# Altium footprint library agh_racing_2018.PcbLib: 174 footprints (part 1 of 11)
Each footprint in its own frame and in the unit in brackets; x right, y up, seen from the top. Pads: shape width x height; smd on the part's side, far side on the other; paste and mask are expansions set on the pad; w line width, h text height; cw(c..) or ccw(c..) is an arc to the next point about the centre after c.
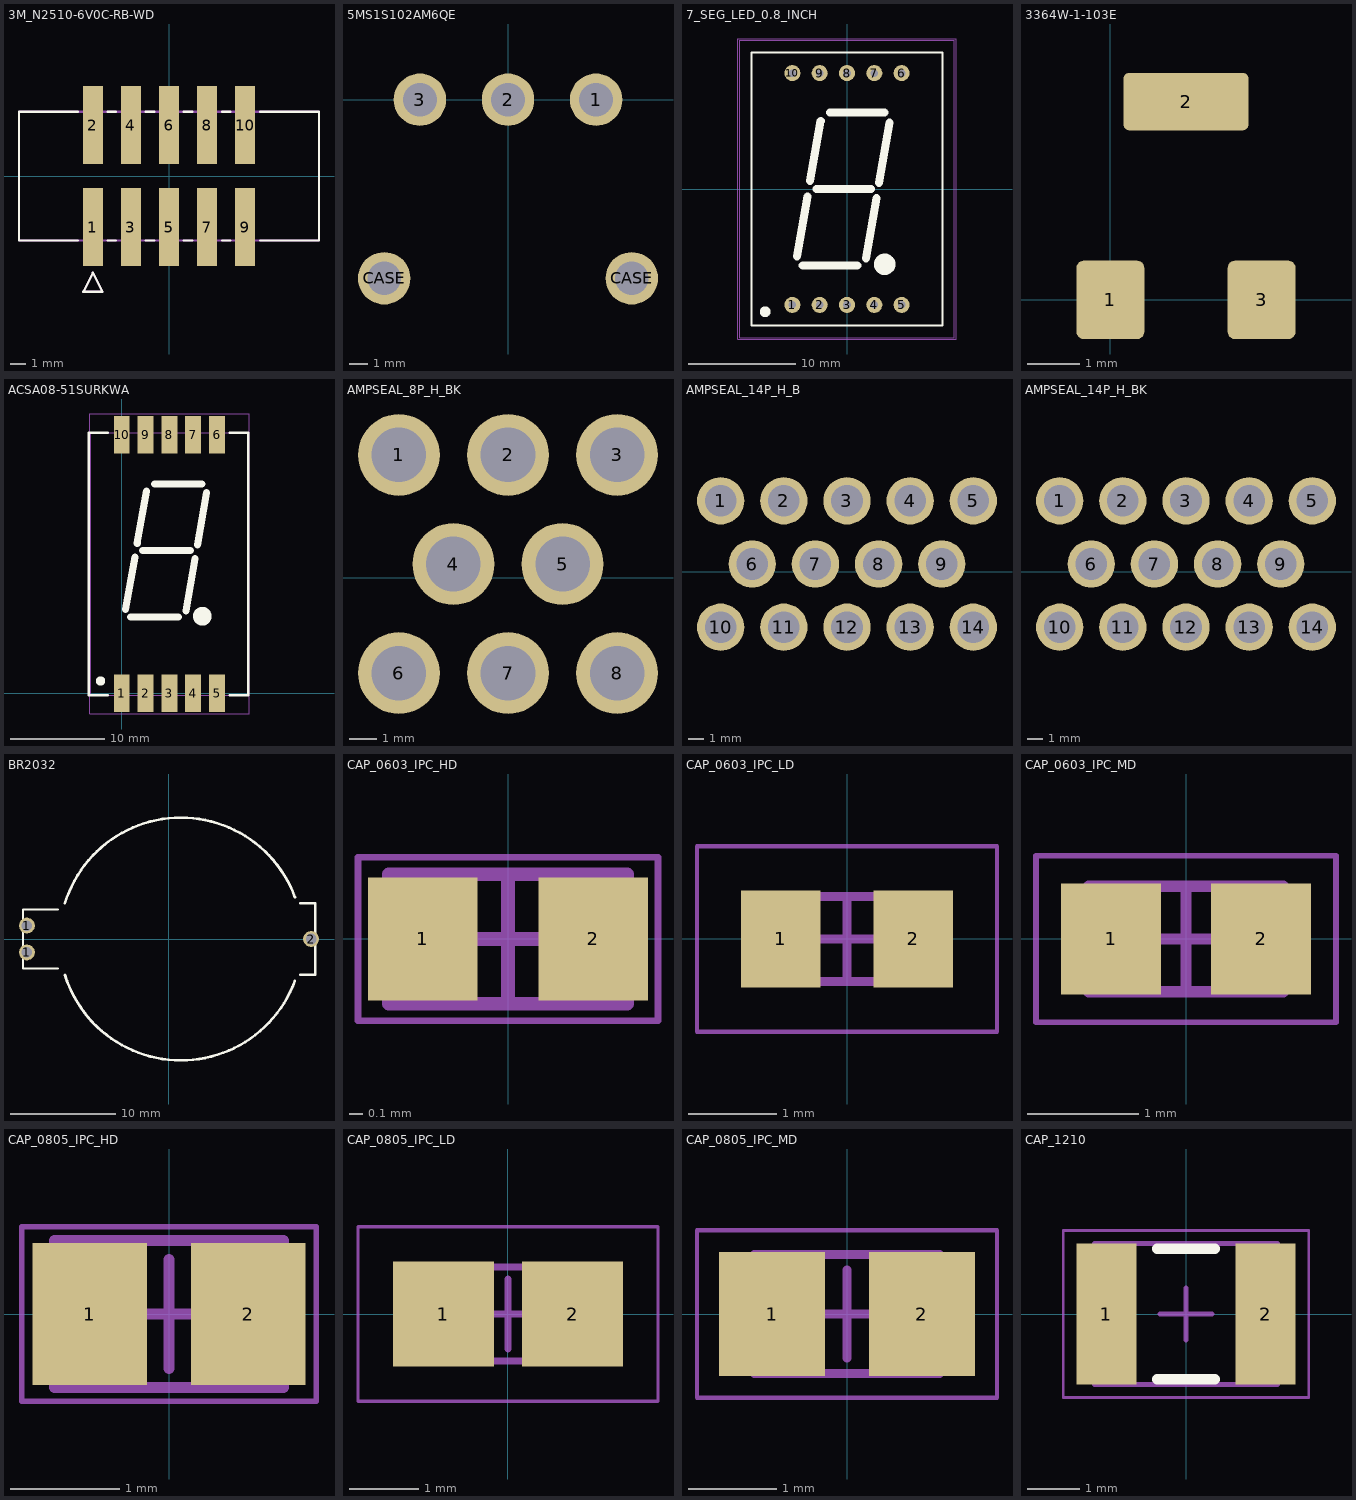
[diagram p0: the footprints below, top view; thin cyan lines are the x and y axes]

## 3M_N2510-6V0C-RB-WD [mil]
pads (10):
  rect 52x204 smd: 1(-200,-134) 2(-200,134) 3(-100,-134) 4(-100,134) 5(0,-134) 6(0,134) 7(100,-134) 8(100,134) 9(200,-134) 10(200,134)
Top Overlay:
  lines w6: -239,-169 -394,-169 -394,169 -239,169 ; -161,-169 -139,-169 ; -161,169 -139,169 ; -61,-169 -39,-169 ; -61,169 -39,169 ; 39,-169 61,-169 ; 39,169 61,169 ; 139,-169 161,-169 ; 139,169 161,169 ; 195,-173 195,-188 205,-188 205,-173 ; 239,-169 394,-169 394,169 239,169 ; -225,-304 -175,-304 -200,-254 -225,-304
Mechanical 15:
  lines w6: -394,-169 -394,169 394,169 394,-169 -394,-169 ; -225,-304 -175,-304 -200,-254 -225,-304

## 5MS1S102AM6QE [mm] "Slide switch, 2 pos, right angle"
height 6.6
pads (5):
  round 2.8 hole 1.8: 1(4.7,0) 2(0,0) 3(-4.7,0) CASE(-6.605,-9.53) CASE(6.605,-9.53)
3D body "slide_switch.SLDPRT": height 6.61, standoff -3.17, extent -6.785,-15.488 6.785,0.635

## 7_SEG_LED_0.8_INCH [mm] "OPTO PLUS LED CORP. OPD-S8023LB-BW"
height 10
pads (10):
  round 1.5 hole 0.7: 1(-5.08,-10.8) 2(-2.54,-10.8) 3(0,-10.8) 4(2.54,-10.8) 5(5.08,-10.8) 6(5.08,10.8) 7(2.54,10.8) 8(0,10.8) 9(-2.54,10.8) 10(-5.08,10.8)
Top Overlay:
  circle w0.5: c-7.62,-11.43 r0.25
  circle w1: c3.511,-7.01 r0.5
  lines w0.2: -8.89,-12.7 8.89,-12.7 8.89,12.7 -8.89,12.7 -8.89,-12.7
  lines w0.762: -4.661,-6.266 -3.681,-0.686 ; -4.122,-7.112 0.958,-7.112 ; -3.432,0.762 -2.452,6.342 ; -2.852,0 2.228,0 ; -1.582,7.112 3.498,7.112 ; 1.761,-6.442 2.741,-0.862 ; 2.99,0.586 3.97,6.166
Mechanical 1:
  lines w0.1: -10,-13.85 -10,13.85 10,13.85 10,-13.85 -10,-13.85
Mechanical 15:
  lines w0.05: -10.16,-13.97 -10.16,13.97 10.16,13.97 10.16,-13.97 -10.16,-13.97
3D body: height 12.5, standoff 2.5, extent -10,-13.85 10,13.85

## 3364W-1-103E [mm] "Trimming Potentiometer"
height 1.5
pads (3):
  rrect20% 1.3x1.5 smd: 1(0,0) 3(2.9,0)
  rrect20% 2.4x1.1 smd: 2(1.45,3.8)
3D body "pot_trim_bourns.SLDPRT": height 1.01, standoff -0.03, extent -0.45,-0.55 3.35,3.95

## ACSA08-51SURKWA [mm] "Kingbright 0.8\" SMD, common anode"
height 10
pads (10):
  rect 1.7x4 smd: 1(0,0) 2(2.54,0) 3(5.08,0) 4(7.62,0) 5(10.16,0) 6(10.16,27.6) 7(7.62,27.6) 8(5.08,27.6) 9(2.54,27.6) 10(0,27.6)
Top Overlay:
  circle w0.5: c-2.261,1.321 r0.25
  circle w1: c8.591,8.23 r0.5
  lines w0.254: -1.5,-0.2 -3.5,-0.2 -3.5,27.8 -1.5,27.8 ; 11.5,-0.2 13.5,-0.2 13.5,27.8 11.5,27.8
  lines w0.762: 0.419,8.974 1.399,14.554 ; 0.958,8.128 6.038,8.128 ; 1.648,16.002 2.628,21.582 ; 2.228,15.24 7.308,15.24 ; 3.498,22.352 8.578,22.352 ; 6.841,8.798 7.821,14.378 ; 8.07,15.826 9.05,21.406
Mechanical 1:
  lines w0.1: -3.32,-0.2 13.48,-0.2 13.48,27.8 -3.32,27.8 -3.32,-0.2
Mechanical 15:
  lines w0.05: -3.42,-2.2 -3.42,29.8 13.58,29.8 13.58,-2.2 -3.42,-2.2
3D body "ACSX08-51.STEP": height 3.8, standoff 0, extent -3.32,-0.2 13.48,27.8

## AMPSEAL_8P_H_BK [mm] "Ampseal socket, 8P, horizontal, black"
height 28
pads (8):
  round 3 hole 2: 1(6.5,4.5) 2(10.5,4.5) 3(14.5,4.5) 4(8.5,0.5) 5(12.5,0.5) 6(6.5,-3.5) 7(10.5,-3.5) 8(14.5,-3.5)
via 21,0 diameter 3.1 hole 3
via 0,0 diameter 3.1 hole 3
3D body "Ampseal_8P_Black.SLDPRT": height 27.78, standoff -4.32, extent -9.9,-31.3 30.9,6.5

## AMPSEAL_14P_H_B [mm] "Ampseal socket, 14P, horizontal, blue"
height 28
pads (14):
  round 3 hole 2: 1(6.5,4.5) 2(10.5,4.5) 3(14.5,4.5) 4(18.5,4.5) 5(22.5,4.5) 6(8.5,0.5) 7(12.5,0.5) 8(16.5,0.5) 9(20.5,0.5) 10(6.5,-3.5) 11(10.5,-3.5) 12(14.5,-3.5) 13(18.5,-3.5) 14(22.5,-3.5)
via 0,0 diameter 3.1 hole 3
via 29,0 diameter 3.1 hole 3
3D body "Ampseal_14P_Blue.SLDPRT": height 27.78, standoff -4.32, extent -9.9,-31.3 38.9,6.5

## AMPSEAL_14P_H_BK [mm] "Ampseal socket, 14P, horizontal, black"
height 28
pads (14):
  round 3 hole 2: 1(6.5,4.5) 2(10.5,4.5) 3(14.5,4.5) 4(18.5,4.5) 5(22.5,4.5) 6(8.5,0.5) 7(12.5,0.5) 8(16.5,0.5) 9(20.5,0.5) 10(6.5,-3.5) 11(10.5,-3.5) 12(14.5,-3.5) 13(18.5,-3.5) 14(22.5,-3.5)
via 0,0 diameter 3.1 hole 3
via 29,0 diameter 3.1 hole 3
3D body "Ampseal_14P_Black.SLDPRT": height 27.78, standoff -4.32, extent -9.9,-31.3 38.9,6.5

## BR2032 [mm]
pads (3):
  round 1.5 hole 1: 1(-13.46,-1.27) 1(-13.46,1.27) 2(13.46,0)
Top Overlay:
  lines w0.2: -10.54,-2.8 -13.84,-2.8 -13.84,2.8 -10.54,2.8
  lines w0.254: -9.863,3.376 cw(c1.13,0) 11.93,3.952 ; -9.855,-3.404 ccw(c1.13,0) 11.918,-3.984 ; 12.46,-3.4 13.86,-3.4 13.86,3.4 12.46,3.4
3D body "c-120591-1-j1-3d.stp": height 6.02, standoff -3.43, extent -13.645,-9.525 13.66,9.525

## CAP_0603_IPC_HD [mm] "Chip Capacitor, 2-Leads, Body 1,60x0,80mm, IPC High Density"
height 0.95
pads (2):
  rect 0.8x0.9 smd: 1(-0.625,0) 2(0.625,0)
Mechanical 13:
  lines w0.1: -0.875,-0.475 -0.875,0.475 0.875,0.475 0.875,-0.475 -0.875,-0.475
Mechanical 15:
  lines w0.05: -1.1,-0.6 -1.1,0.6 1.1,0.6 1.1,-0.6 -1.1,-0.6
  lines w0.1: -0.475,0 0.475,0 ; 0,-0.475 0,0.475
3D body "CAP_0603_IPC_HD.step": height 0.95, standoff 0, extent -0.875,-0.475 0.875,0.475

## CAP_0603_IPC_LD [mm] "Chip Capacitor, 2-Leads, Body 1.60x0.81mm, IPC Low Density"
height 0.9
pads (2):
  rect 0.9x1.1 smd: 1(-0.75,0) 2(0.75,0)
Mechanical 13:
  lines w0.1: -0.875,-0.48 0.875,-0.48 0.875,0.48 -0.875,0.48 -0.875,-0.48
Mechanical 15:
  lines w0.05: -1.7,-1.05 1.7,-1.05 1.7,1.05 -1.7,1.05 -1.7,-1.05
  lines w0.1: -0.48,0 0.48,0 ; 0,-0.48 0,0.48
3D body "CAP_0603_IPC_LD.step": height 0.9, standoff 0, extent -0.875,-0.48 0.875,0.48

## CAP_0603_IPC_MD [mm] "Chip Capacitor, 2-Leads, Body 1,60x0,80mm, IPC Medium Density"
height 0.95
pads (2):
  rect 0.9x1 smd: 1(-0.675,0) 2(0.675,0)
Mechanical 13:
  lines w0.1: -0.875,-0.475 -0.875,0.475 0.875,0.475 0.875,-0.475 -0.875,-0.475
Mechanical 15:
  lines w0.05: -1.35,-0.75 -1.35,0.75 1.35,0.75 1.35,-0.75 -1.35,-0.75
  lines w0.1: -0.475,0 0.475,0 ; 0,-0.475 0,0.475
3D body "CAP_C0603_IPC_MD.step": height 0.95, standoff 0, extent -0.875,-0.475 0.875,0.475

## CAP_0805_IPC_HD [mm] "Chip Capacitor, 2-Leads, Body 2.00x1.25mm, IPC High Density"
height 0.9
pads (2):
  rect 1.05x1.3 smd: 1(-0.725,0) 2(0.725,0)
Mechanical 13:
  lines w0.1: -1.05,-0.675 -1.05,0.675 1.05,0.675 1.05,-0.675 -1.05,-0.675
Mechanical 15:
  lines w0.05: -1.35,-0.8 -1.35,0.8 1.35,0.8 1.35,-0.8 -1.35,-0.8
  lines w0.1: -0.5,0 0.5,0 ; 0,-0.5 0,0.5
3D body "CAP_0805_IPC_HD.step": height 0.9, standoff 0, extent -1.05,-0.675 1.05,0.675

## CAP_0805_IPC_LD [mm] "Chip Capacitor, 2-Leads, Body 2.00x1.25mm, IPC Low Density"
height 0.9
pads (2):
  rect 1.45x1.5 smd: 1(-0.925,0) 2(0.925,0)
Mechanical 13:
  lines w0.1: -1.05,-0.675 1.05,-0.675 1.05,0.675 -1.05,0.675 -1.05,-0.675
Mechanical 15:
  lines w0.05: -2.15,-1.25 2.15,-1.25 2.15,1.25 -2.15,1.25 -2.15,-1.25
  lines w0.1: -0.5,0 0.5,0 ; 0,-0.5 0,0.5
3D body "CAP_0805_IPC_LD.step": height 0.9, standoff 0, extent -1.05,-0.675 1.05,0.675

## CAP_0805_IPC_MD [mm] "Chip Capacitor, 2-Leads, Body 2.00x1.25mm, IPC Medium Density"
height 1.35
pads (2):
  rect 1.2x1.4 smd: 1(-0.85,0) 2(0.85,0)
Mechanical 13:
  lines w0.1: -1.05,-0.675 -1.05,0.675 1.05,0.675 1.05,-0.675 -1.05,-0.675
Mechanical 15:
  lines w0.05: -1.7,-0.95 1.7,-0.95 1.7,0.95 -1.7,0.95 -1.7,-0.95
  lines w0.1: -0.5,0 0.5,0 ; 0,-0.5 0,0.5
3D body "CAP_0805_IPC_MD.step": height 1.35, standoff 0, extent -1.05,-0.675 1.05,0.675

## CAP_1210 [mm] "Chip Capacitor, 2-Leads, Body 3,20x2,50mm, IPC Medium Density"
height 2.7
pads (2):
  rect 1.15x2.7 smd: 1(-1.525,0) 2(1.525,0)
Top Overlay:
  lines w0.2: -0.55,-1.25 0.55,-1.25 ; -0.55,1.25 0.55,1.25
Mechanical 13:
  lines w0.1: -1.75,-1.35 -1.75,1.35 1.75,1.35 1.75,-1.35 -1.75,-1.35
Mechanical 15:
  lines w0.05: -2.35,-1.6 -2.35,1.6 2.35,1.6 2.35,-1.6 -2.35,-1.6
  lines w0.1: -0.5,0 0.5,0 ; 0,-0.5 0,0.5
3D body "CAP_1210.step": height 2.7, standoff 0, extent -1.75,-1.35 1.75,1.35